# Altium footprint library shared_lib.PcbLib: 65 footprints (part 4 of 5)
Each footprint in its own frame and in the unit in brackets; x right, y up, seen from the top. Pads: shape width x height; smd on the part's side, far side on the other; paste and mask are expansions set on the pad; w line width, h text height; cw(c..) or ccw(c..) is an arc to the next point about the centre after c.
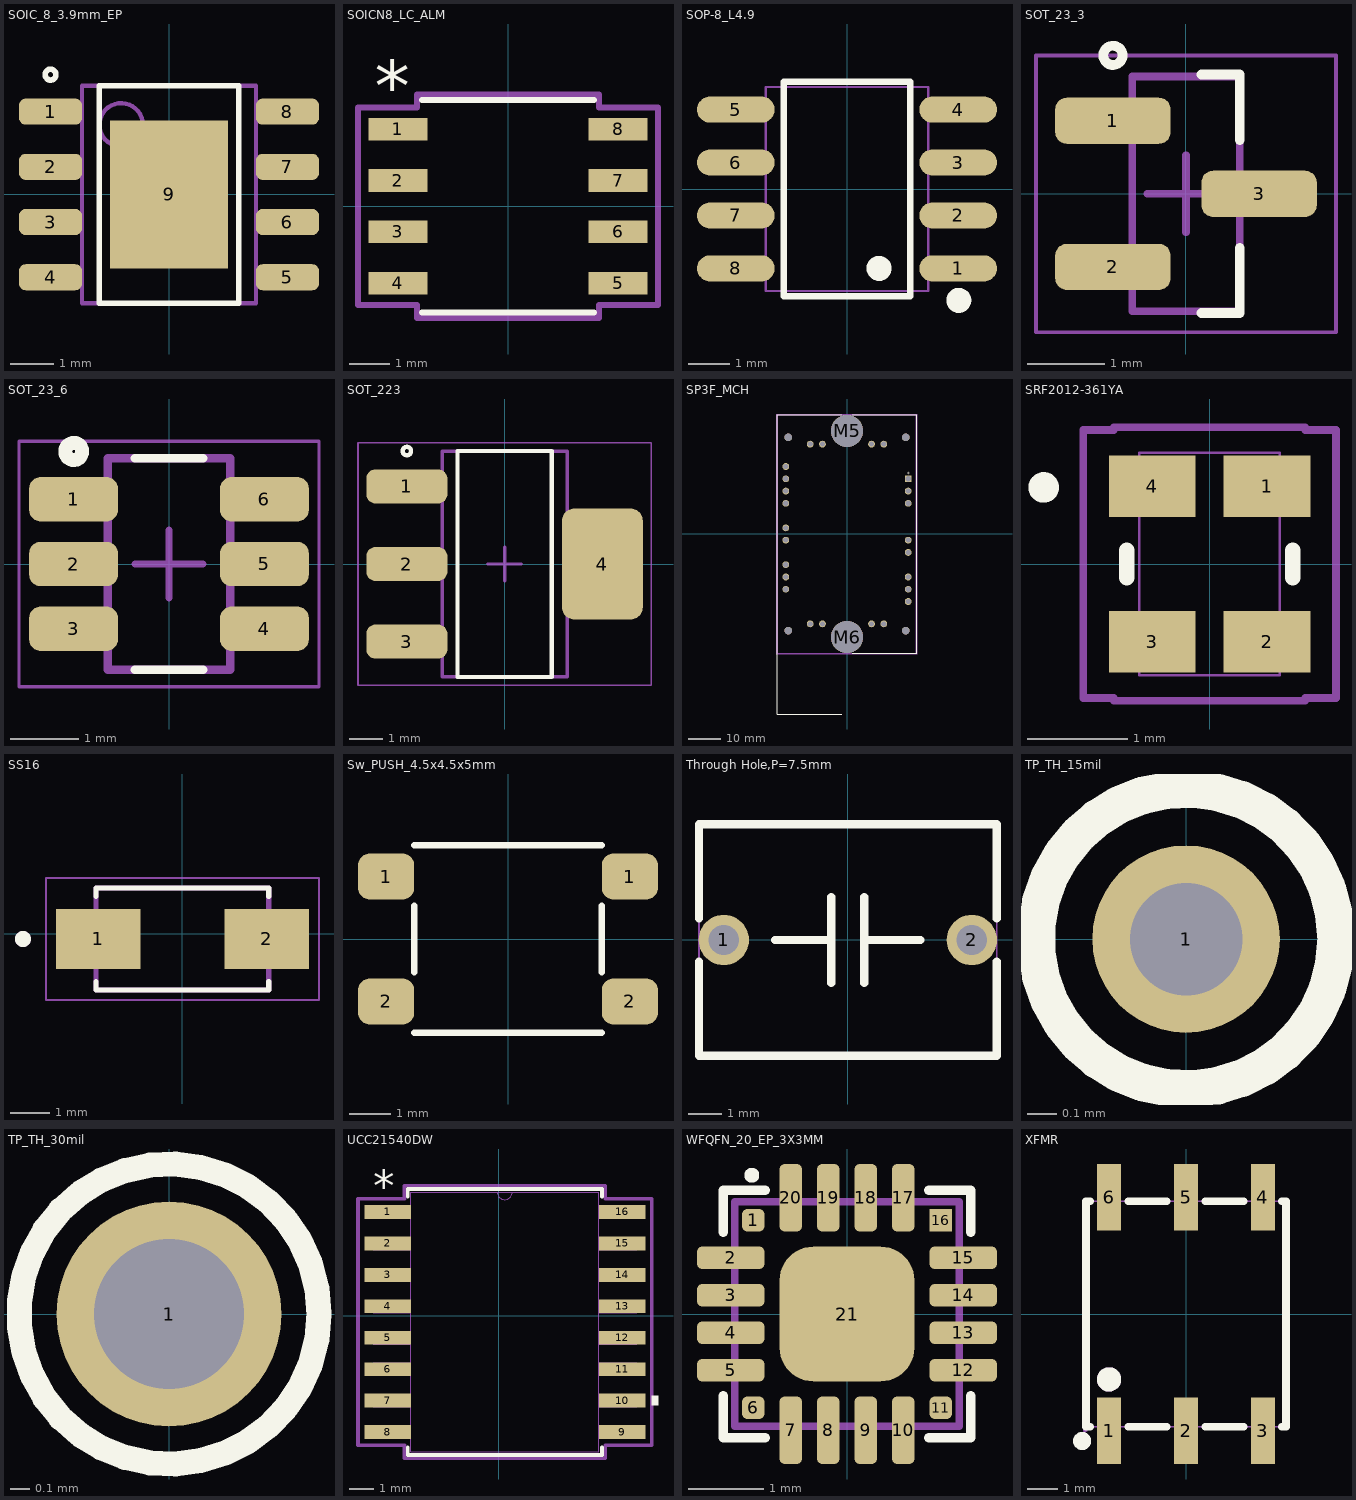
[diagram p3: the footprints below, top view; thin cyan lines are the x and y axes]

## SOIC_8_3.9mm_EP [mm]
pads (9):
  rrect50% 1.45x0.6 smd: 1(-2.725,1.905) 2(-2.725,0.635) 3(-2.725,-0.635) 4(-2.725,-1.905) 5(2.725,-1.905) 6(2.725,-0.635) 7(2.725,0.635) 8(2.725,1.905)
  rect 2.71x3.4 smd: 9(0,0)
Top Overlay:
  circle w0.127: c-2.725,2.755 r0.125
  lines w0.127: -1.6,-2.5 1.6,-2.5 1.6,2.5 -1.6,2.5 -1.6,-2.5
Mechanical 1:
  circle w0.1: c-1.1,1.6 r0.5
  lines w0.1: -2,-2.5 -2,2.5 2,2.5 2,-2.5 -2,-2.5
3D body "step_temp.STEP": height 1.7, standoff 0, extent -3,-2.45 3,2.45

## SOICN8_LC_ALM [mil]
pads (8):
  rect 57.5x22 smd paste+0 mask+0: 1(-107.25,75) 2(-107.25,25) 3(-107.25,-25) 4(-107.25,-75) 5(107.25,-75) 6(107.25,-25) 7(107.25,25) 8(107.25,75)
Top Overlay:
  lines w6: -83.5,-103.5 83.5,-103.5 ; -83.5,103.5 83.5,103.5
  text "*" at -129.75,92 h50
Mechanical 15:
  lines w6: -146,-96 -146,96 -88.5,96 -88.5,108.5 88.5,108.5 88.5,96 146,96 146,-96 88.5,-96 88.5,-108.5 -88.5,-108.5 -88.5,-96 -146,-96
3D body "SOICN8_LC_ALM.step": height 69.09, standoff 0, extent -122.01,-98.5 122.01,98.5

## SOP-8_L4.9 [mm]
pads (8):
  oval 1.865x0.63 smd: 1(2.667,-1.905) 2(2.667,-0.635) 3(2.667,0.635) 4(2.667,1.905) 5(-2.667,1.905) 6(-2.667,0.635) 7(-2.667,-0.635) 8(-2.667,-1.905)
Top Overlay:
  circle w0.3: c0.769,-1.905 r0.15
  circle w0.3: c2.682,-2.672 r0.15
  lines w0.152: -1.522,-2.576 1.521,-2.576 1.521,2.576 -1.522,2.576 -1.522,-2.576
Mechanical 15:
  lines w0.051: -1.95,-2.45 1.95,-2.45 1.95,2.45 -1.95,2.45 -1.95,-2.45
3D body: height 0, standoff 0, extent -3.599,-2.22 3.599,2.22

## SOT_23_3 [mm]
pads (3):
  rrect50% 1.5x0.6 smd: 1(-0.95,0.95) 2(-0.95,-0.95) 3(0.95,0)
Top Overlay:
  circle w0.127: c-0.95,1.8 r0.125
  lines w0.127: 0.2,-1.55 0.7,-1.55 0.7,-0.7 ; 0.2,1.55 0.7,1.55 0.7,0.7
Mechanical 1:
  lines w0.1: -0.7,-1.525 0.7,-1.525 0.7,1.525 -0.7,1.525 -0.7,-1.525
Mechanical 15:
  lines w0.05: -1.95,-1.8 -1.95,1.8 1.95,1.8 1.95,-1.8 -1.95,-1.8
  lines w0.1: -0.5,0 0.5,0 ; 0,-0.5 0,0.5
3D body: height 1.12, standoff 0.01, extent -0.7,-1.525 0.7,1.525

## SOT_23_6 [mm]
height 1.45
pads (6):
  rrect50% 1.3x0.65 smd: 1(-1.4,0.95) 2(-1.4,0) 3(-1.4,-0.95) 4(1.4,-0.95) 5(1.4,0) 6(1.4,0.95)
Top Overlay:
  circle w0.203: c-1.397,1.651 r0.125
  lines w0.127: -0.5,-1.55 0.5,-1.55 ; -0.5,1.55 0.5,1.55
Mechanical 1:
  lines w0.127: -0.9,-1.55 -0.9,1.55 0.9,1.55 0.9,-1.55 -0.9,-1.55
Mechanical 15:
  lines w0.05: -2.2,-1.8 2.2,-1.8 2.2,1.8 -2.2,1.8 -2.2,-1.8
  lines w0.1: -0.5,0 0.5,0 ; 0,-0.5 0,0.5
3D body "SOT23-6-2.step": height 1.45, standoff 0, extent -1.501,-1.45 1.299,1.45

## SOT_223 [mm]
height 1.45
pads (4):
  rrect50% 2.4x1 smd: 1(-2.9,2.3) 2(-2.9,0) 3(-2.9,-2.3)
  rrect30% 2.4x3.3 smd: 4(2.9,0)
Top Overlay:
  circle w0.127: c-2.9,3.35 r0.125
  lines w0.127: -1.4,-3.35 1.4,-3.35 1.4,3.35 -1.4,3.35 -1.4,-3.35
Mechanical 1:
  lines w0.1: -1.855,-3.35 1.855,-3.35 1.855,3.35 -1.855,3.35 -1.855,-3.35
Mechanical 15:
  lines w0.05: -4.35,-3.6 4.35,-3.6 4.35,3.6 -4.35,3.6 -4.35,-3.6
  lines w0.1: -0.5,0 0.5,0 ; 0,-0.5 0,0.5
3D body: height 1.8, standoff 0.03, extent -1.855,-3.35 1.855,3.35

## SP3F_MCH [mil]
pads (31):
  rect 83x83 hole 63 paste-99999 mask-41.5: 2(748.03,674.78)
  round 83 hole 63 paste-99999 mask+0: 3(748.03,524.78) 4(748.03,374.78) 7(748.03,-75.22) 8(748.03,-225.22) 10(748.03,-525.22) 11(748.03,-675.22) 12(748.03,-825.22) 13(450,-1098.45) 14(300,-1098.45) 15(-300,-1098.45) 16(-450,-1098.45) 18(-748.03,-675.22) 19(-748.03,-525.22) 20(-748.03,-375.22) 22(-748.03,-75.22) 23(-748.03,74.78) 25(-748.03,374.78) 26(-748.03,524.78) 27(-748.03,674.78) 28(-748.03,824.78) 29(-450,1098.4) 30(-300,1098.4) 31(300,1098.4) 32(450,1098.4)
  round 93 hole 93 unplated paste-99999 mask+0: M1(-718.5,1181.1) M2(718.5,1181.1) M3(-718.5,-1181.1) M4(718.5,-1181.1)
  round 394 hole 394 unplated paste-99999 mask+0: M5(0,1259.84) M6(0,-1259.84)
Top Overlay:
  lines w6: -65.41,-2200 -851.5,-2200 -851.5,1459.5 -65.41,1459.5 ; 65.41,-1459.5 851.5,-1459.5 851.5,1459.5 65.41,1459.5
  text "*" at 735.53,714.78 h50
Mechanical 13:
  lines w1: -12,1454.5 ccw(c0,1454.5) 12,1454.5 ; -846.5,-1454.5 -846.5,1454.5 846.5,1454.5 846.5,-1454.5 -846.5,-1454.5
  text "*" at 795.53,654.78 h50
Mechanical 15:
  lines w6: -856.5,-1464.5 856.5,-1464.5 856.5,1464.5 -856.5,1464.5 -856.5,-1464.5

## SRF2012-361YA [mil]
pads (4):
  rect 34x24 smd paste+0 mask+0: 1(22.5,30.5) 2(22.5,-30.5) 3(-22.5,-30.5) 4(-22.5,30.5)
Top Overlay:
  circle w6: c-65,30 r3
  lines w6: -32.5,-5.4 -32.5,5.4 ; 32.5,-5.4 32.5,5.4
Mechanical 13:
  lines w1: -27.5,-43.5 27.5,-43.5 27.5,43.5 -27.5,43.5 -27.5,-43.5
Mechanical 15:
  lines w3: -49.5,-52.5 -49.5,52.5 -37.5,52.5 -37.5,53.5 37.5,53.5 37.5,52.5 49.5,52.5 49.5,-52.5 37.5,-52.5 37.5,-53.5 -37.5,-53.5 -37.5,-52.5 -49.5,-52.5
3D body "IND_BOURNS_SRF2012A.step": height 55.12, standoff 0, extent -27.52,-43.5 27.52,43.5

## SS16 [mm]
pads (2):
  rect 2.12x1.5 smd: 1(-2.115,-0.127) 2(2.115,-0.127)
Top Overlay:
  circle w0.2: c-4,-0.127 r0.1
  lines w0.127: -2.165,-1.197 -2.165,-1.407 2.165,-1.407 2.165,-1.197 ; -2.165,0.943 -2.165,1.153 2.165,1.153 2.165,0.943
Mechanical 13:
  circle w0.2: c-4,-0.127 r0.1
  lines w0.127: -2.165,-1.407 -2.165,1.153 2.165,1.153 2.165,-1.407 -2.165,-1.407
Mechanical 15:
  lines w0.05: -3.425,-1.657 -3.425,1.403 3.425,1.403 3.425,-1.657 -3.425,-1.657
3D body "step_temp.STEP": height 2.5, standoff 0, extent -2.57,-1.407 2.57,1.153

## Sw_PUSH_4.5x4.5x5mm [mm]
pads (4):
  rrect50% 1.35x1.1 smd: 1(-2.925,1.5) 1(2.925,1.5) 2(-2.925,-1.5) 2(2.925,-1.5)
Top Overlay:
  lines w0.152: -2.25,-2.25 2.25,-2.25 ; -2.25,-0.8 -2.25,0.8 ; -2.25,2.25 2.25,2.25 ; 2.25,-0.8 2.25,0.8
3D body: height 2.75, standoff 0, extent -2.25,-2.25 2.25,2.25
3D body: height 5, standoff 0, extent -1.22,-1.22 1.22,1.22

## Through Hole,P=7.5mm [mil]
pads (2):
  round 60 hole 36 paste-99999 mask+1.97: 1(-147.64,0) 2(147.64,0)
Top Overlay:
  lines w10: -177.16,-25.58 -177.16,-137.79 177.17,-137.79 177.17,-25.58 ; -177.16,25.58 -177.16,137.79 177.17,137.79 177.17,25.58 ; -86.61,0 -19.68,0 ; -19.68,-51.18 -19.68,51.18 ; 19.69,-51.22 19.69,35.88 19.69,51.18 ; 19.69,0 86.61,0
Mechanical 15:
  region: -174.8,137.79 -174.8,136.81 -176.18,135.43 -178.14,135.43 -179.52,136.81 -179.52,137.79 -179.52,138.77 -178.14,140.15 -176.18,140.15 -174.8,138.77 -174.8,137.79
  region: 159.46,0 159.46,-2.35 157.66,-6.69 154.33,-10.01 149.99,-11.81 145.29,-11.81 140.95,-10.01 137.62,-6.69 135.82,-2.35 135.82,0 135.82,2.35 137.62,6.7 140.95,10.02 145.29,11.82 149.99,11.82 154.33,10.02 157.66,6.7 159.46,2.35 159.46,0
  region: -135.82,0 -135.82,-2.35 -137.62,-6.69 -140.95,-10.01 -145.29,-11.81 -149.99,-11.81 -154.33,-10.01 -157.66,-6.69 -159.46,-2.35 -159.46,0 -159.46,2.35 -157.66,6.7 -154.33,10.02 -149.99,11.82 -145.29,11.82 -140.95,10.02 -137.62,6.7 -135.82,2.35 -135.82,0
  lines w2: -177.16,-137.8 -177.16,137.79 177.17,137.79 177.17,-137.8 -177.16,-137.8

## TP_TH_15mil [mil]
pads (1):
  round 25 hole 15: 1(0,0)
Top Overlay:
  circle w5: c0,0 r20
Bottom Overlay:
  circle w5: c0,0 r20

## TP_TH_30mil [mil]
pads (1):
  round 45 hole 30: 1(0,0)
Top Overlay:
  circle w5: c0,0 r30
Bottom Overlay:
  circle w5: c0,0 r30

## UCC21540DW [mil]
pads (16):
  rect 74x22 smd paste+0 mask+0: 1(-176.5,165) 2(-176.5,115) 3(-176.5,65) 4(-176.5,15) 5(-176.5,-35) 6(-176.5,-85) 7(-176.5,-135) 8(-176.5,-185) 9(196.5,-185) 10(196.5,-135) 11(196.5,-85) 12(196.5,-35) 13(196.5,15) 14(196.5,65) 15(196.5,115) 16(196.5,165)
Top Overlay:
  region: 243.5,-127.5 253.5,-127.5 253.5,-142.5 243.5,-142.5
  lines w6: -144.5,-209.1 -144.5,-221.5 164.5,-221.5 164.5,-209.1 ; -144.5,189.1 -144.5,201.5 164.5,201.5 164.5,189.1
  text "*" at -199,182 h50
Mechanical 13:
  lines w1: -2,196.5 ccw(c10,196.5) 22,196.5 ; -199.5,-195 -139.5,-195 -139.5,-175 -199.5,-175 -199.5,-195 ; -199.5,-145 -139.5,-145 -139.5,-125 -199.5,-125 -199.5,-145 ; -199.5,-95 -139.5,-95 -139.5,-75 -199.5,-75 -199.5,-95 ; -199.5,-45 -139.5,-45 -139.5,-25 -199.5,-25 -199.5,-45 ; -199.5,5 -139.5,5 -139.5,25 -199.5,25 -199.5,5 ; -199.5,55 -139.5,55 -139.5,75 -199.5,75 -199.5,55 ; -199.5,105 -139.5,105 -139.5,125 -199.5,125 -199.5,105 ; -199.5,155 -139.5,155 -139.5,175 -199.5,175 -199.5,155 ; -139.5,-216.5 -139.5,196.5 159.5,196.5 159.5,-216.5 -139.5,-216.5 ; 159.5,-195 219.5,-195 219.5,-175 159.5,-175 159.5,-195 ; 159.5,-145 219.5,-145 219.5,-125 159.5,-125 159.5,-145 ; 159.5,-95 219.5,-95 219.5,-75 159.5,-75 159.5,-95 ; 159.5,-45 219.5,-45 219.5,-25 159.5,-25 159.5,-45 ; 159.5,5 219.5,5 219.5,25 159.5,25 159.5,5 ; 159.5,55 219.5,55 219.5,75 159.5,75 159.5,55 ; 159.5,105 219.5,105 219.5,125 159.5,125 159.5,105 ; 159.5,155 219.5,155 219.5,175 159.5,175 159.5,155
Mechanical 15:
  lines w6: -223.5,-206 -149.5,-206 -149.5,-226.5 169.5,-226.5 169.5,-206 243.5,-206 243.5,186 169.5,186 169.5,206.5 -149.5,206.5 -149.5,186 -223.5,186 -223.5,-206
3D body "DW16_TEX.step": height 104.09, standoff 0, extent -199.56,-216.32 219.41,196.68

## WFQFN_20_EP_3X3MM [mm]
pads (21):
  rrect50% 0.3x0.3 smd: 1(-1.25,1.25) 6(-1.25,-1.25) 11(1.25,-1.25)
  rrect50% 0.9x0.3 smd: 2(-1.55,0.75) 3(-1.55,0.25) 4(-1.55,-0.25) 5(-1.55,-0.75) 12(1.55,-0.75) 13(1.55,-0.25) 14(1.55,0.25) 15(1.55,0.75)
  rrect50% 0.3x0.9 smd: 7(-0.75,-1.55) 8(-0.25,-1.55) 9(0.25,-1.55) 10(0.75,-1.55) 17(0.75,1.55) 18(0.25,1.55) 19(-0.25,1.55) 20(-0.75,1.55)
  rect 0.3x0.3 smd: 16(1.25,1.25)
  rrect50% 1.8x1.8 smd: 21(0,0)
Top Overlay:
  circle w0.1: c-1.27,1.85 r0.05
  lines w0.127: -1.65,-1.092 -1.65,-1.65 -1.092,-1.65 ; -1.65,1.092 -1.65,1.65 -1.092,1.65 ; 1.092,-1.65 1.65,-1.65 1.65,-1.092 ; 1.092,1.65 1.65,1.65 1.65,1.092
Mechanical 1:
  lines w0.1: -1.5,-1.5 1.5,-1.5 1.5,1.5 -1.5,1.5 -1.5,-1.5
3D body: height 0.8, standoff 0, extent -1.5,-1.5 1.5,1.5

## XFMR [mm]
pads (6):
  rect 0.8x2.2 smd paste+0 mask+0.05: 1(-2.54,-3.85) 2(0,-3.85) 3(2.54,-3.85) 4(2.54,3.85) 5(0,3.85) 6(-2.54,3.85)
Top Overlay:
  circle w0.3: c-3.429,-4.191 r0.15
  circle w0.4: c-2.54,-2.159 r0.2
  lines w0.254: -3.171,-3.725 -3.302,-3.725 -3.302,3.725 -3.171,3.725 ; -1.909,-3.725 -0.631,-3.725 ; -1.909,3.725 -0.631,3.725 ; 0.631,-3.725 1.909,-3.725 ; 0.631,3.725 1.909,3.725 ; 3.171,-3.725 3.302,-3.725 3.302,3.725 3.171,3.725
Mechanical 6:
  circle w0.4: c-2.54,-2.159 r0.2
Mechanical 15:
  region: -3.265,-3.85 -3.265,-3.875 -3.3,-3.91 -3.35,-3.91 -3.385,-3.875 -3.385,-3.85 -3.385,-3.825 -3.35,-3.79 -3.3,-3.79 -3.265,-3.825
  region: -2.69,2.85 -2.69,3.85 -2.39,3.85 -2.39,2.85
  region: -0.15,2.85 -0.15,3.85 0.15,3.85 0.15,2.85
  region: 2.39,2.85 2.39,3.85 2.69,3.85 2.69,2.85
  region: 2.39,-3.85 2.39,-2.85 2.69,-2.85 2.69,-3.85
  region: -0.15,-3.85 -0.15,-2.85 0.15,-2.85 0.15,-3.85
  region: -2.69,-3.85 -2.69,-2.85 -2.39,-2.85 -2.39,-3.85
  lines w0.051: -3.325,-3.725 -3.325,3.725 3.325,3.725 3.325,-3.725 -3.325,-3.725